# Altium integrated library MU_MP_39_V1.IntLib: 148 symbols (part 1 of 2) (continued)
## K4E8E304EE-EGCE (continued)

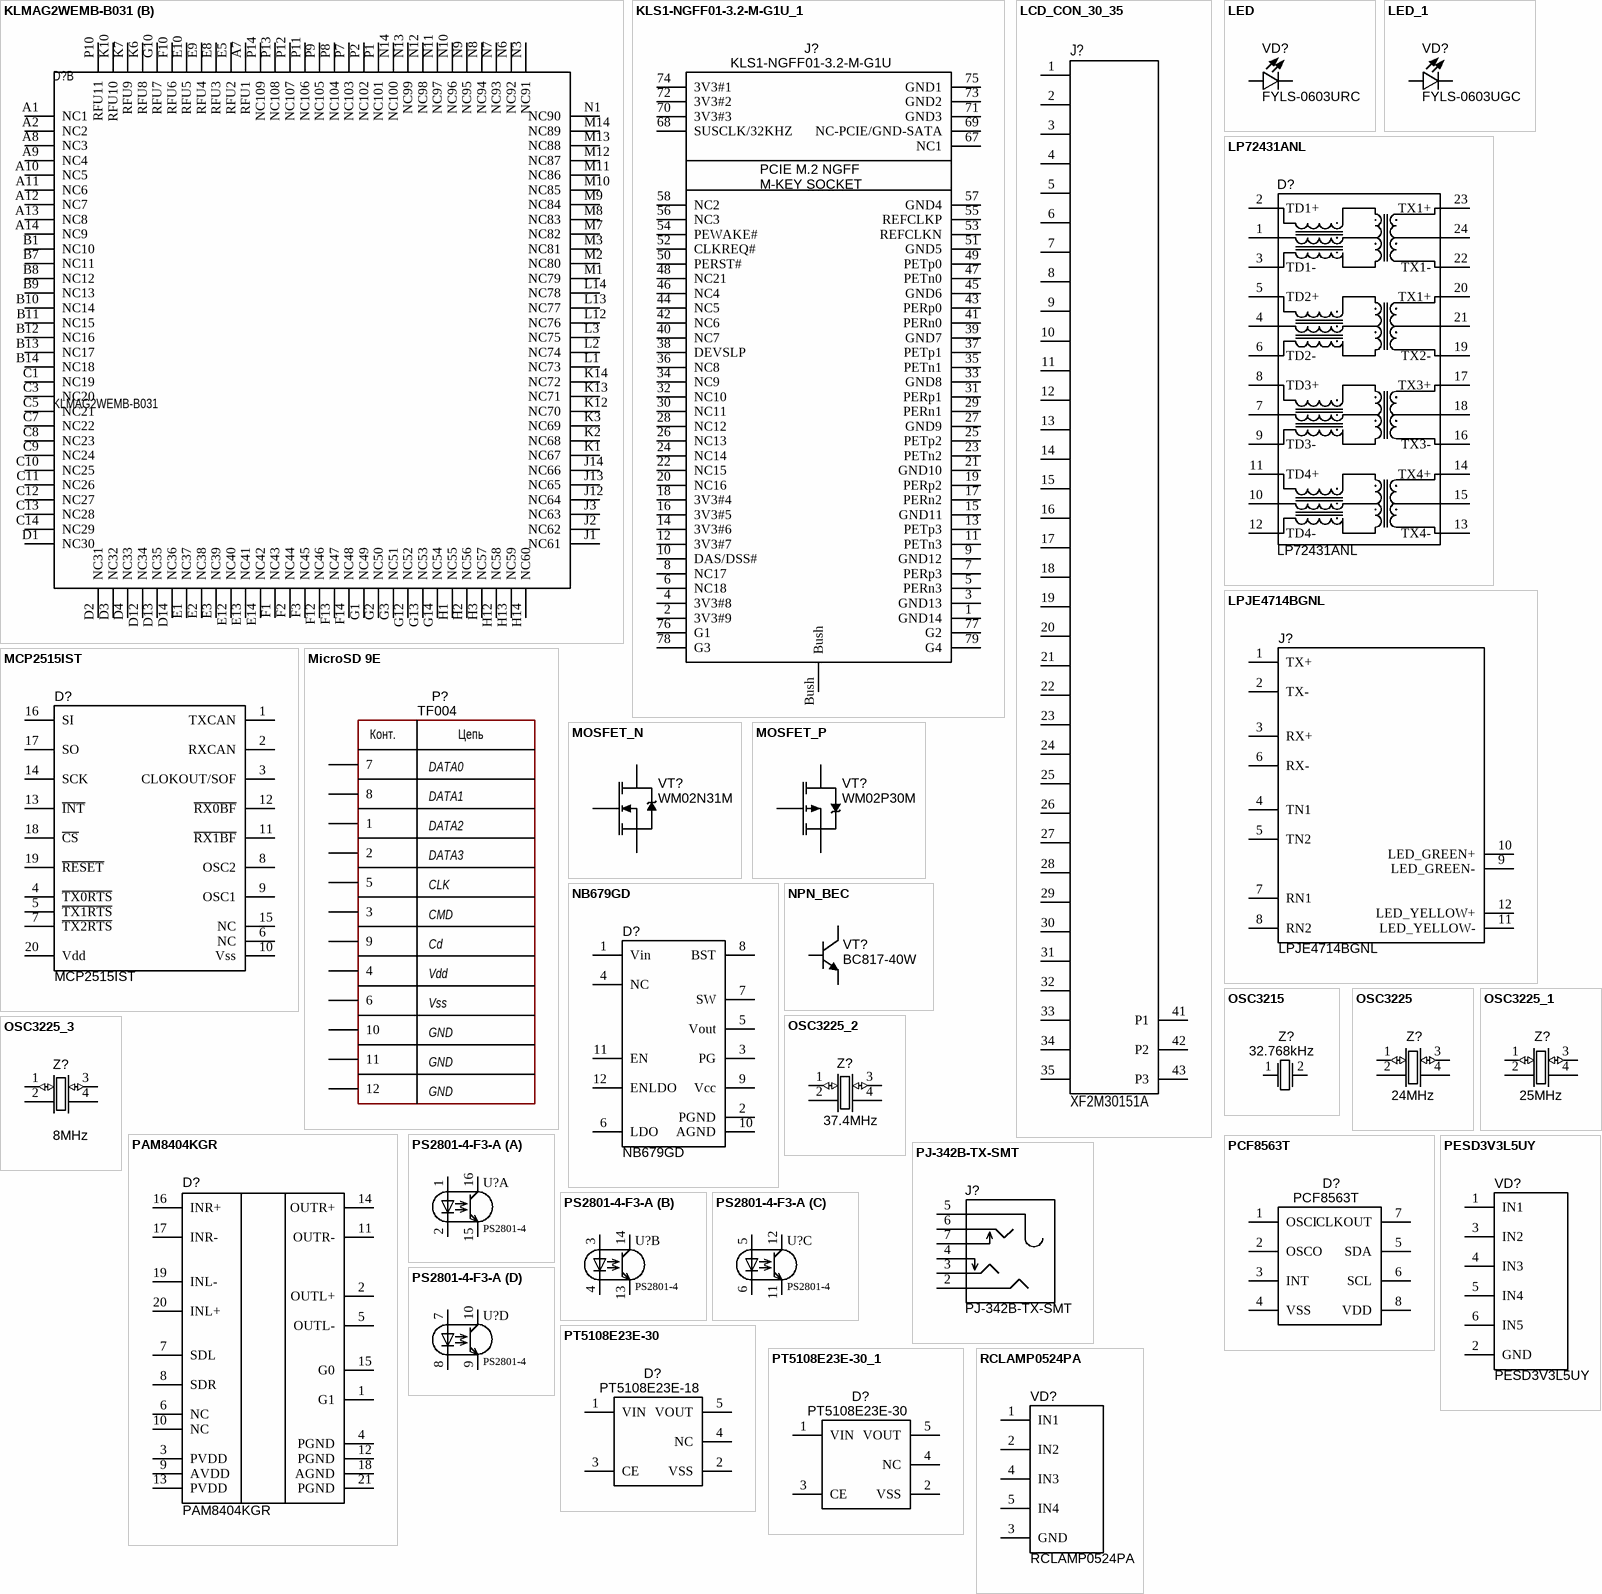
[diagram p3: symbols KLMAG2WEMB-B031 to RCLAMP0524PA]

## KLMAG2WEMB-B031
designator D?
ComponentType: *; Manufacter: *; Package: FBGA153; PartNumber: KLMAG2WEMB-B031; ClassName: *; Value: KLMAG2WEMB-B031
footprint FBGA153
part A pins: A3 DATA0, A4 DATA1, A5 DATA2, A6 VSS, B2 DATA3, B3 DATA4, B4 DATA5, B5 DATA6, B6 DATA7, C2 VDDIM, C4 VSS, C6 VDD, E6 VDDF, E7 VSS, F5 VDDF, G5 VSS, H5 DS, H10 VSS, J5 VSS, J10 VDDF, K5 ~{RST}, K8 VSS, K9 VDDF, M4 VDD, M5 CMD, M6 CLK, N2 VSS, N4 VDD, N5 VSS, P3 VDD, P4 VSS, P5 VDD, P6 VSS
part B pins: A1 NC1, A2 NC2, A7 RFU1, A8 NC3, A9 NC4, A10 NC5, A11 NC6, A12 NC7, A13 NC8, A14 NC9, B1 NC10, B7 NC11, B8 NC12, B9 NC13, B10 NC14, B11 NC15, B12 NC16, B13 NC17, B14 NC18, C1 NC19, C3 NC20, C5 NC21, C7 NC22, C8 NC23, C9 NC24, C10 NC25, C11 NC26, C12 NC27, C13 NC28, C14 NC29, D1 NC30, D2 NC31, D3 NC32, D4 NC33, D12 NC34, D13 NC35, D14 NC36, E1 NC37, E2 NC38, E3 NC39, E5 RFU2, E8 RFU3, E9 RFU4, E10 RFU5, E12 NC40, E13 NC41, E14 NC42, F1 NC43, F2 NC44, F3 NC45, F10 RFU6, F12 NC46, F13 NC47, F14 NC48, G1 NC49, G2 NC50, G3 NC51, G10 RFU7, G12 NC52, G13 NC53, G14 NC54, H1 NC55, H2 NC56, H3 NC57, H12 NC58, H13 NC59, H14 NC60, J1 NC61, J2 NC62, J3 NC63, J12 NC64, J13 NC65, J14 NC66, K1 NC67, K2 NC68, K3 NC69, K6 RFU8, K7 RFU9, K10 RFU10, K12 NC70, K13 NC71, K14 NC72, L1 NC73, L2 NC74, L3 NC75, L12 NC76, L13 NC77, L14 NC78, M1 NC79, M2 NC80, M3 NC81, M7 NC82, M8 NC83, M9 NC84, M10 NC85, M11 NC86, M12 NC87, M13 NC88, M14 NC89, N1 NC90, N3 NC91, N6 NC92, N7 NC93, N8 NC94, N9 NC95, N10 NC96, N11 NC97, N12 NC98, N13 NC99, N14 NC100, P1 NC101, P2 NC102, P7 NC103, P8 NC104, P9 NC105, P10 RFU11, P11 NC106, P12 NC107, P13 NC108, P14 NC109

## KLS1-NGFF01-3.2-M-G1U_1
designator J?, comment KLS1-NGFF01-3.2-M-G1U
ComponentType: SMD Chip Resistor; Manufacter: *; Voltage: *; ClassName: *; Tolerance: *; PartNumber: KLS1-NGFF01-3.2-M-G1U; Package: KLS1-NGFF01-3.2-M-G1U; Value: KLS1-NGFF01-3.2-M-G1U
footprint KLS1-NGFF01-3.2-M-G1U_42mm
pins: 1 GND14, 2 3V3#9, 3 GND13, 4 3V3#8, 5 PERn3, 6 NC18, 7 PERp3, 8 NC17, 9 GND12, 10 DAS/DSS#, 11 PETn3, 12 3V3#7, 13 PETp3, 14 3V3#6, 15 GND11, 16 3V3#5, 17 PERn2, 18 3V3#4, 19 PERp2, 20 NC16, 21 GND10, 22 NC15, 23 PETn2, 24 NC14, 25 PETp2, 26 NC13, 27 GND9, 28 NC12, 29 PERn1, 30 NC11, 31 PERp1, 32 NC10, 33 GND8, 34 NC9, 35 PETn1, 36 NC8, 37 PETp1, 38 DEVSLP, 39 GND7, 40 NC7, 41 PERn0, 42 NC6, 43 PERp0, 44 NC5, 45 GND6, 46 NC4, 47 PETn0, 48 NC21, 49 PETp0, 50 PERST#, 51 GND5, 52 CLKREQ#, 53 REFCLKN, 54 PEWAKE#, 55 REFCLKP, 56 NC3, 57 GND4, 58 NC2, 67 NC1, 68 SUSCLK/32KHZ, 69 NC-PCIE/GND-SATA, 70 3V3#3, 71 GND3, 72 3V3#2, 73 GND2, 74 3V3#1, 75 GND1, 76 G1, 77 G2, 78 G3, 79 G4, Bush
text: PCIE M.2 NGFF / M-KEY SOCKET

## LCD_CON_30_35
designator J?, comment XF2M30151A
ComponentType: *; Manufacter: *; Package: XF2M30151A; PartNumber: XF2M30151A; ClassName: *; Value: XF2M30151A
footprint XF2M-30_3515-1A (Rotary Backclock Connector 40 pin)
pins: 1, 2, 3, 4, 5, 6, 7, 8, 9, 10, 11, 12, 13, 14, 15, 16, 17, 18, 19, 20, 21, 22, 23, 24, 25, 26, 27, 28, 29, 30, 31, 32, 33, 34, 35, 41 P1, 42 P2, 43 P3

## LED
designator VD?, comment FYLS-0603URC
ComponentType: *; Manufacter: *; Package: SMD0603; PartNumber: FYLS-0603URC; Value: FYLS-0603URC
footprint LED_0603
pins: 1 A, 2 C

## LED_1
designator VD?, comment FYLS-0603UGC
ComponentType: *; Manufacter: *; Package: SMD0603; PartNumber: FYLS-0603UGC; Value: FYLS-0603UGC
footprint LED_0603
pins: 1 A, 2 C

## LP72431ANL
designator D?
ComponentType: *; Manufacter: *; Voltage: *; ClassName: *; Tolerance: *; PartNumber: LP72431ANL; Package: LP72431ANL; Value: LP72431ANL
footprint LP72431ANL (pitch 1.27 mm)
pins: 1 TCT1, 2 TD1+, 3 TD1-, 4 TCT2, 5 TD2+, 6 TD2-, 7 TCT3, 8 TD3+, 9 TD3-, 10 TCT4, 11 TD4+, 12 TD4-, 13 TX4-, 14 TX4+, 15 TCT_4, 16 TX3-, 17 TX3+, 18 TCT_3, 19 TX2-, 20 TX1+, 21 TCT_2, 22 TX1-, 23 TX1+, 24 TCT_1

## LPJE4714BGNL
designator J?
ComponentType: *; Manufacter: *; Voltage: *; ClassName: *; Tolerance: *; PartNumber: LPJE4714BGNL; Package: LPJE4714BGNL; Value: LPJE4714BGNL
footprint LPJE4714BGNL
pins: 1 TX+, 2 TX-, 3 RX+, 4 TN1, 5 TN2, 6 RX-, 7 RN1, 8 RN2, 9 LED_GREEN-, 10 LED_GREEN+, 11 LED_YELLOW-, 12 LED_YELLOW+

## MCP2515IST
designator D?
ComponentType: SMD Chip Resistor; Manufacter: *; Voltage: *; ClassName: *; Tolerance: *; PartNumber: MCP2515IST; Package: TSSOP-20; Value: MCP2515IST
footprint TSSOP-20
pins: 1 TXCAN, 2 RXCAN, 3 CLOKOUT/SOF, 4 ~{TX0RTS}, 5 ~{TX1RTS}, 6 NC, 7 ~{TX2RTS}, 8 OSC2, 9 OSC1, 10 Vss, 11 ~{RX1BF}, 12 ~{RX0BF}, 13 ~{INT}, 14 SCK, 15 NC, 16 SI, 17 SO, 18 ~{CS}, 19 ~{RESET}, 20 Vdd

## MicroSD 9E
designator P?, comment TF004
ComponentType: MicroSD conector; Manufacter: *; Package: TF004; PartNumber: TF004; Value: TF004
footprint CON: PLD-12
footprint TF004 (micro sd holder 10 pin)
pins: 1, 2, 3 (power), 4 (power), 5 (power), 6 (power), 7 (power), 8 (power), 9 (power), 10 (power), 11 (power), 12 (power)
text: Конт.; Цепь; DATA0; DATA1; DATA2; DATA3; CLK; CMD; Cd; Vdd; Vss; GND

## MOSFET_N
designator VT?, comment value WM02N31M  (hidden comment: Value)
ComponentType: *; Manufacter: *; Package: SOT23; PartNumber: WM02N31M; ClassName: *
footprint SOT23
pins: 1 G, 2 S, 3 D

## MOSFET_P
designator VT?, comment value WM02P30M  (hidden comment: Value)
ComponentType: *; Manufacter: *; Package: SOT23; PartNumber: WM02P30M; ClassName: *
footprint SOT23
pins: 1 G, 2 S, 3 D

## NB679GD
designator D?
ComponentType: SMD Chip Resistor; Manufacter: *; Voltage: *; ClassName: *; Tolerance: *; PartNumber: NB679GD; Package: QFN-12; Value: NB679GD
footprint QFN-12_2mmx3mm
pins: 1 Vin, 2 PGND, 3 PG, 4 NC, 5 Vout, 6 LDO, 7 SW, 8 BST, 9 Vcc, 10 AGND, 11 EN, 12 ENLDO

## NPN_BEC
designator VT?, comment BC817-40W
ComponentType: *; Manufacter: *; Package: SC-70; PartNumber: BC817-40W; ClassName: *; Value: BC817-40W
footprint SOT23
footprint SC-70
pins: 1 B, 2 E, 3 C

## OSC3215
designator Z?, comment value 32.768kHz  (hidden comment: Value)
PartNumber: SJK-7L-32.768-12.5-20-70-C; ComponentType: *; Manufacter: *; Package: TSX3215
footprint TSX3215
pins: 1, 2

## OSC3225
designator Z?, comment value 24MHz  (hidden comment: Value)
PartNumber: 12.88665; ComponentType: *; Manufacter: *; Package: TSX3225
footprint TSX3225
pins: 1 IN/OUT (io), 2 GND, 3 IN/OUT (io), 4 GND

## OSC3225_1
designator Z?, comment value 25MHz  (hidden comment: Value)
PartNumber: X322525MOB4SI; ComponentType: *; Manufacter: *; Package: TSX3225
footprint TSX3225
pins: 1 IN/OUT (io), 2 GND, 3 IN/OUT (io), 4 GND

## OSC3225_2
designator Z?, comment value 37.4MHz  (hidden comment: Value)
PartNumber: X3225374MOB4SI; ComponentType: *; Manufacter: *; Package: TSX3225
footprint TSX3225
pins: 1 IN/OUT (io), 2 GND, 3 IN/OUT (io), 4 GND

## OSC3225_3
designator Z?, comment value 8MHz  (hidden comment: Value)
PartNumber: X32258MOB4SI; ComponentType: *; Manufacter: *; Package: TSX3225
footprint TSX3225
pins: 1 IN/OUT (io), 2 GND, 3 IN/OUT (io), 4 GND

## PAM8404KGR
designator D?
ComponentType: SMD Chip Resistor; Manufacter: *; Voltage: *; ClassName: *; Tolerance: *; PartNumber: PAM8404KGR; Package: QFN-20; Value: PAM8404KGR
footprint QFN-20 4mmx4mm
pins: 1 G1, 2 OUTL+, 3 PVDD, 4 PGND, 5 OUTL-, 6 NC, 7 SDL, 8 SDR, 9 AVDD, 10 NC, 11 OUTR-, 12 PGND, 13 PVDD, 14 OUTR+, 15 G0, 16 INR+, 17 INR-, 18 AGND, 19 INL-, 20 INL+, 21 PGND

## PCF8563T
designator D?
ComponentType: SMD Chip Resistor; Manufacter: *; Voltage: *; ClassName: *; Tolerance: *; PartNumber: PCF8563T; Package: SO8; Value: PCF8563T
footprint SO8 (pitch 1.27 mm)
pins: 1 OSCI, 2 OSCO, 3 INT, 4 VSS, 5 SDA, 6 SCL, 7 CLKOUT, 8 VDD

## PESD3V3L5UY
designator VD?
ComponentType: *; Manufacter: *; Package: SC70-6; PartNumber: PESD3V3L5UY; ClassName: *; Value: PESD3V3L5UY
footprint SC70-6 (SOT23, 5-Leads, Body 2,90x2,80mm, Pitch 0,95mm, IPC Medium Density)
pins: 1 IN1, 2 GND, 3 IN2, 4 IN3, 5 IN4, 6 IN5

## PJ-342B-TX-SMT
designator J?
ComponentType: SMD Chip Resistor; Manufacter: *; Voltage: *; ClassName: *; Tolerance: *; PartNumber: PJ-342B-TX-SMT; Package: PJ-342B-TX-SMT; Value: PJ-342B-TX-SMT
footprint PJ-342B-TX-SMT
pins: 2, 3, 4, 5, 6, 7

## PS2801-4-F3-A
designator U?, comment PS2801-4
Optocoupler X4; Manufacturer: Renesas; PartNumber: PS2801-4-F3-A; Comments: 80V, 50mA; Value: PS2801-4; Package: SOIC127P700X210-16N; ClassName: *
footprint SOIC127P700X210-16N (SOIC, 16-Leads, Body 10.30x4.40mm, Pitch 1.27mm, IPC Medium Density)
part A pins: 1 A, 2 C, 15 E, 16 C
part B pins: 3 A, 4 C, 13 E, 14 C
part C pins: 5 A, 6 C, 11 E, 12 C
part D pins: 7 A, 8 C, 9 E, 10 C

## PT5108E23E-30
designator D?, comment PT5108E23E-18
ComponentType: SMD Chip Resistor; Manufacter: *; Voltage: *; ClassName: *; Tolerance: *; PartNumber: PT5108E23E-18; Package: SOT23-5; Value: PT5108E23E-18
footprint SOT23-5 (pitch 0.95 mm)
pins: 1 VIN, 2 VSS, 3 CE, 4 NC, 5 VOUT

## PT5108E23E-30_1
designator D?, comment PT5108E23E-30
ComponentType: SMD Chip Resistor; Manufacter: *; Voltage: *; ClassName: *; Tolerance: *; PartNumber: PT5108E23E-30; Package: SOT23-5; Value: PT5108E23E-30
footprint SOT23-5 (pitch 0.95 mm)
pins: 1 VIN, 2 VSS, 3 CE, 4 NC, 5 VOUT

## RCLAMP0524PA
designator VD?
ComponentType: *; Manufacter: *; Package: RCLAMP0524PA; PartNumber: RCLAMP0524PA; ClassName: *; Value: RCLAMP0524PA
footprint RCLAMP0524PA
pins: 1 IN1, 2 IN2, 3 GND, 4 IN3, 5 IN4

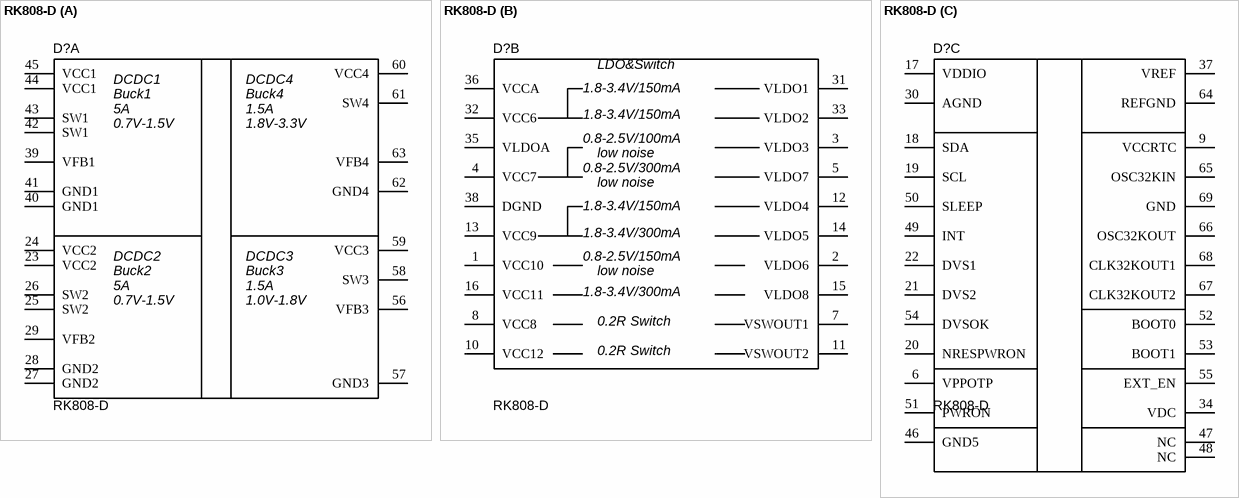
[diagram p4: symbol RK808-D]

## RK808-D
designator D?
ComponentType: SMD Chip Resistor; Manufacter: *; Voltage: *; ClassName: *; Tolerance: *; PartNumber: RK808-D; Package: QFN68; Value: RK808-D
footprint QFN35P700X700X80-69N
part A pins: 23 VCC2, 24 VCC2, 25 SW2, 26 SW2, 27 GND2, 28 GND2, 29 VFB2, 39 VFB1, 40 GND1, 41 GND1, 42 SW1, 43 SW1, 44 VCC1, 45 VCC1, 56 VFB3, 57 GND3, 58 SW3, 59 VCC3, 60 VCC4, 61 SW4, 62 GND4, 63 VFB4
part B pins: 1 VCC10, 2 VLDO6, 3 VLDO3, 4 VCC7, 5 VLDO7, 7 VSWOUT1, 8 VCC8, 10 VCC12, 11 VSWOUT2, 12 VLDO4, 13 VCC9, 14 VLDO5, 15 VLDO8, 16 VCC11, 31 VLDO1, 32 VCC6, 33 VLDO2, 35 VLDOA, 36 VCCA, 38 DGND
part C pins: 6 VPPOTP, 9 VCCRTC, 17 VDDIO, 18 SDA, 19 SCL, 20 NRESPWRON, 21 DVS2, 22 DVS1, 30 AGND, 34 VDC, 37 VREF, 46 GND5, 47 NC, 48 NC, 49 INT, 50 SLEEP, 51 PWRON, 52 BOOT0, 53 BOOT1, 54 DVSOK, 55 EXT_EN, 64 REFGND, 65 OSC32KIN, 66 OSC32KOUT, 67 CLK32KOUT2, 68 CLK32KOUT1, 69 GND

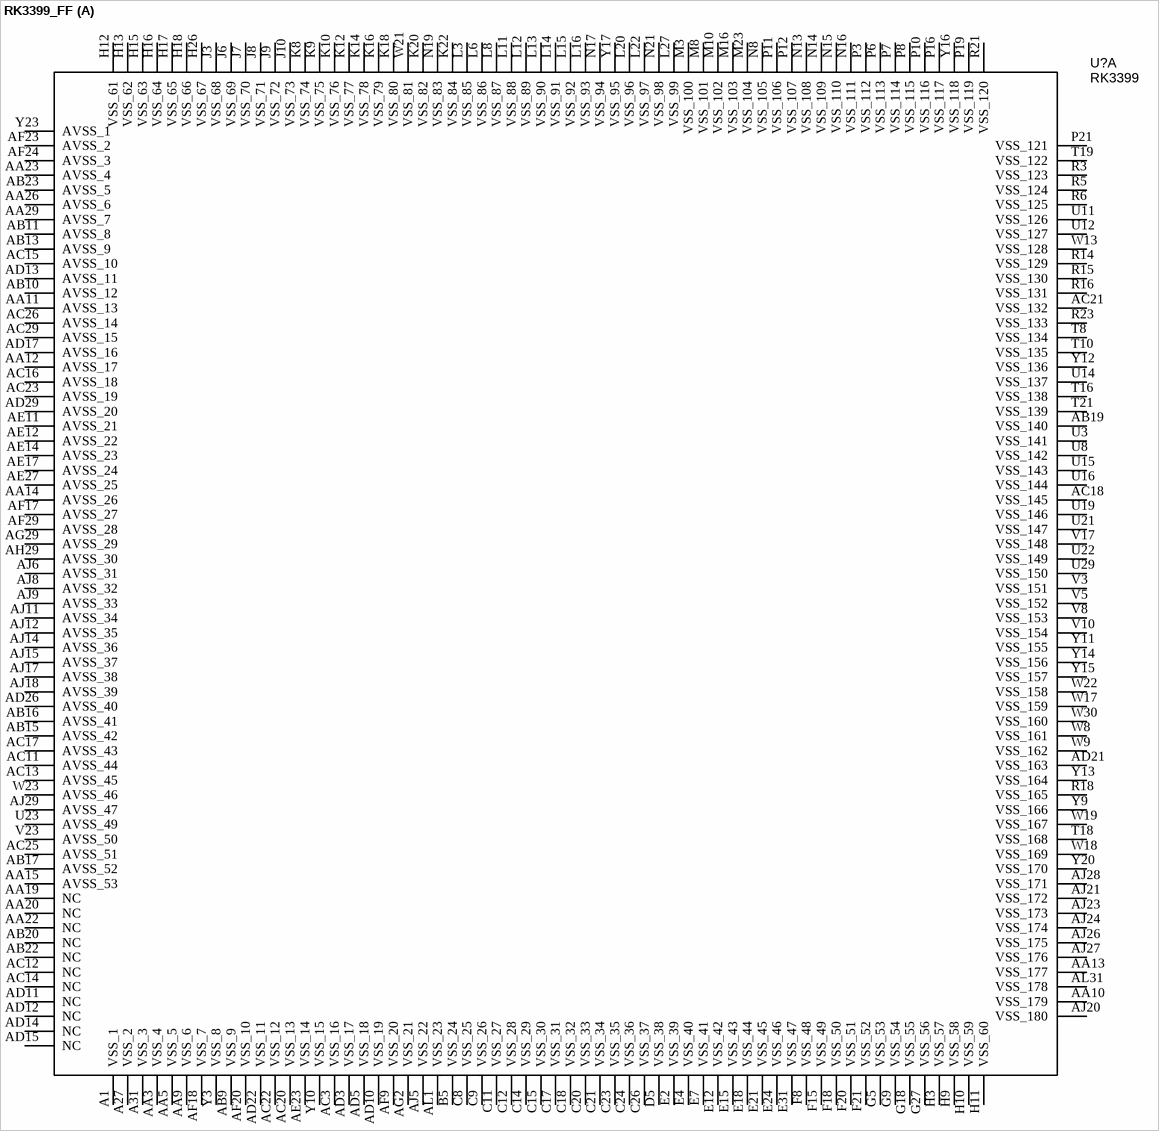
[diagram p5: symbol RK3399_FF]

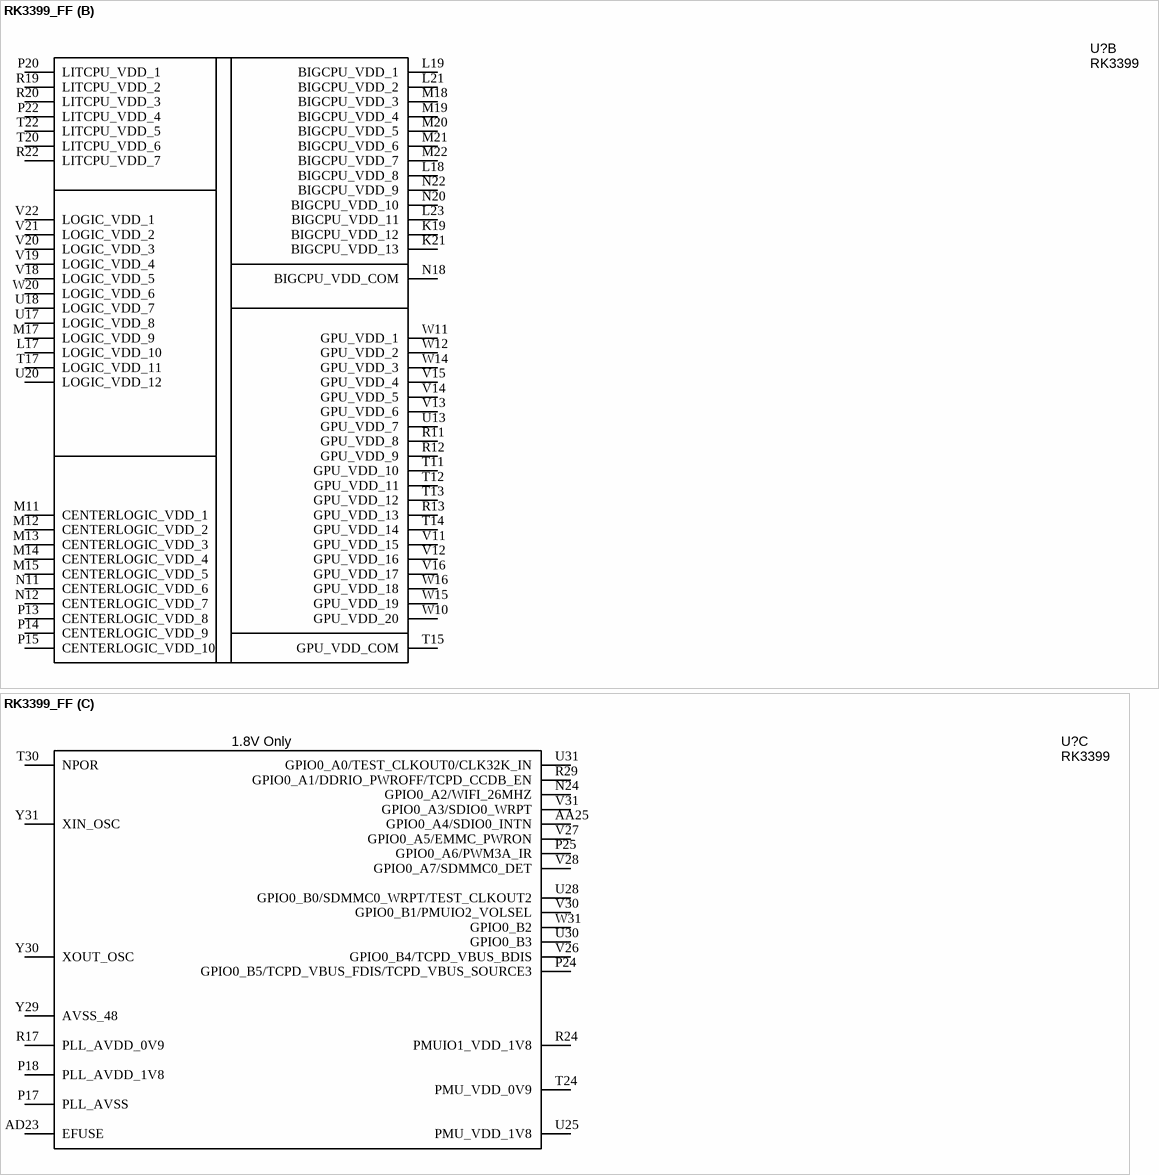
[diagram p6: symbol RK3399_FF]

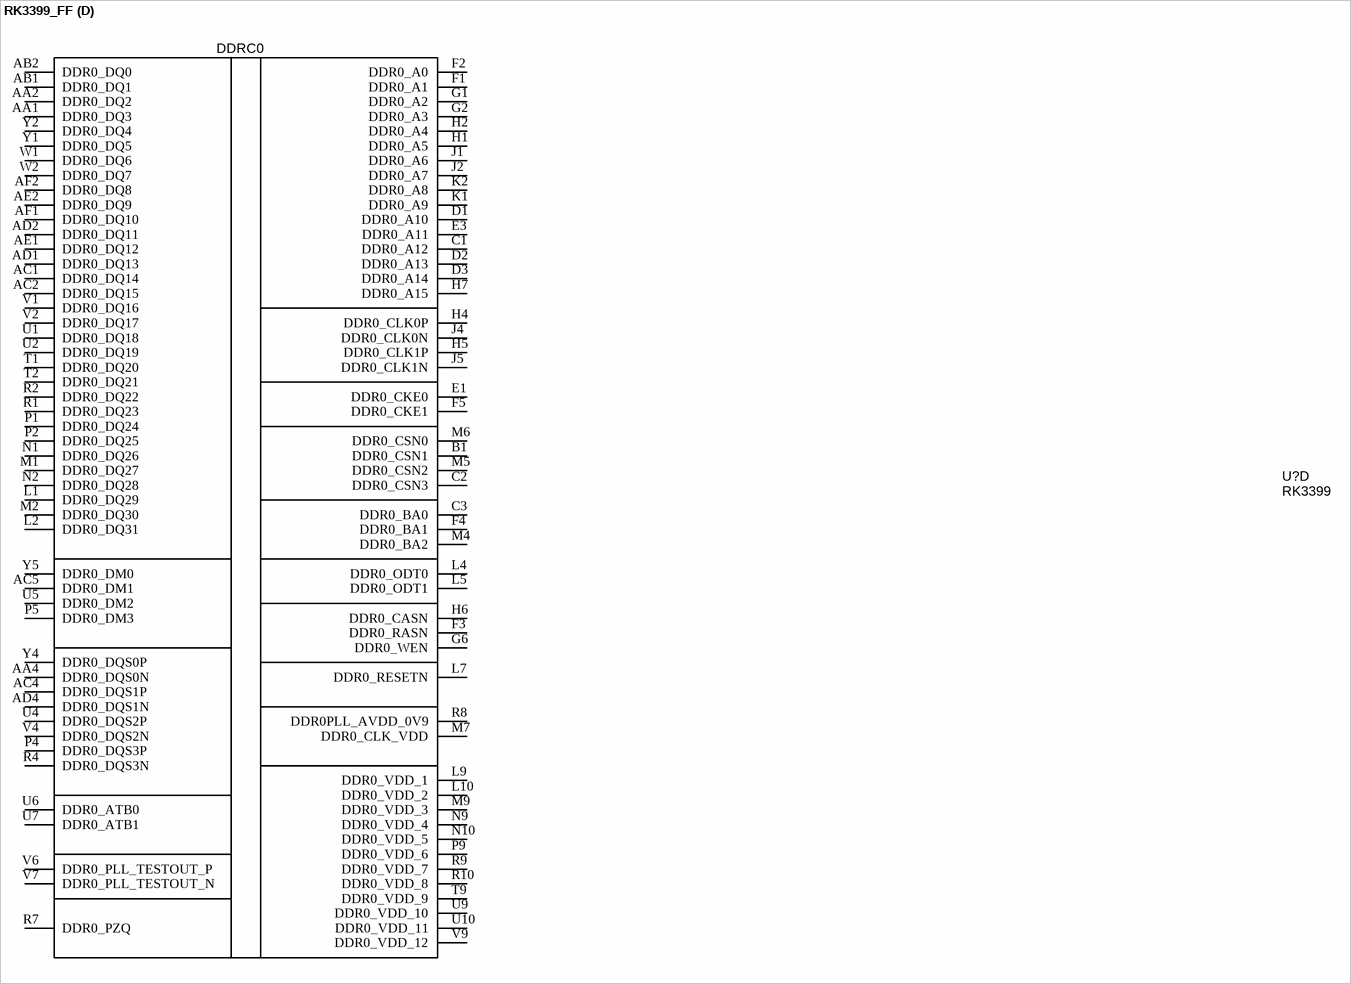
[diagram p7: symbol RK3399_FF]

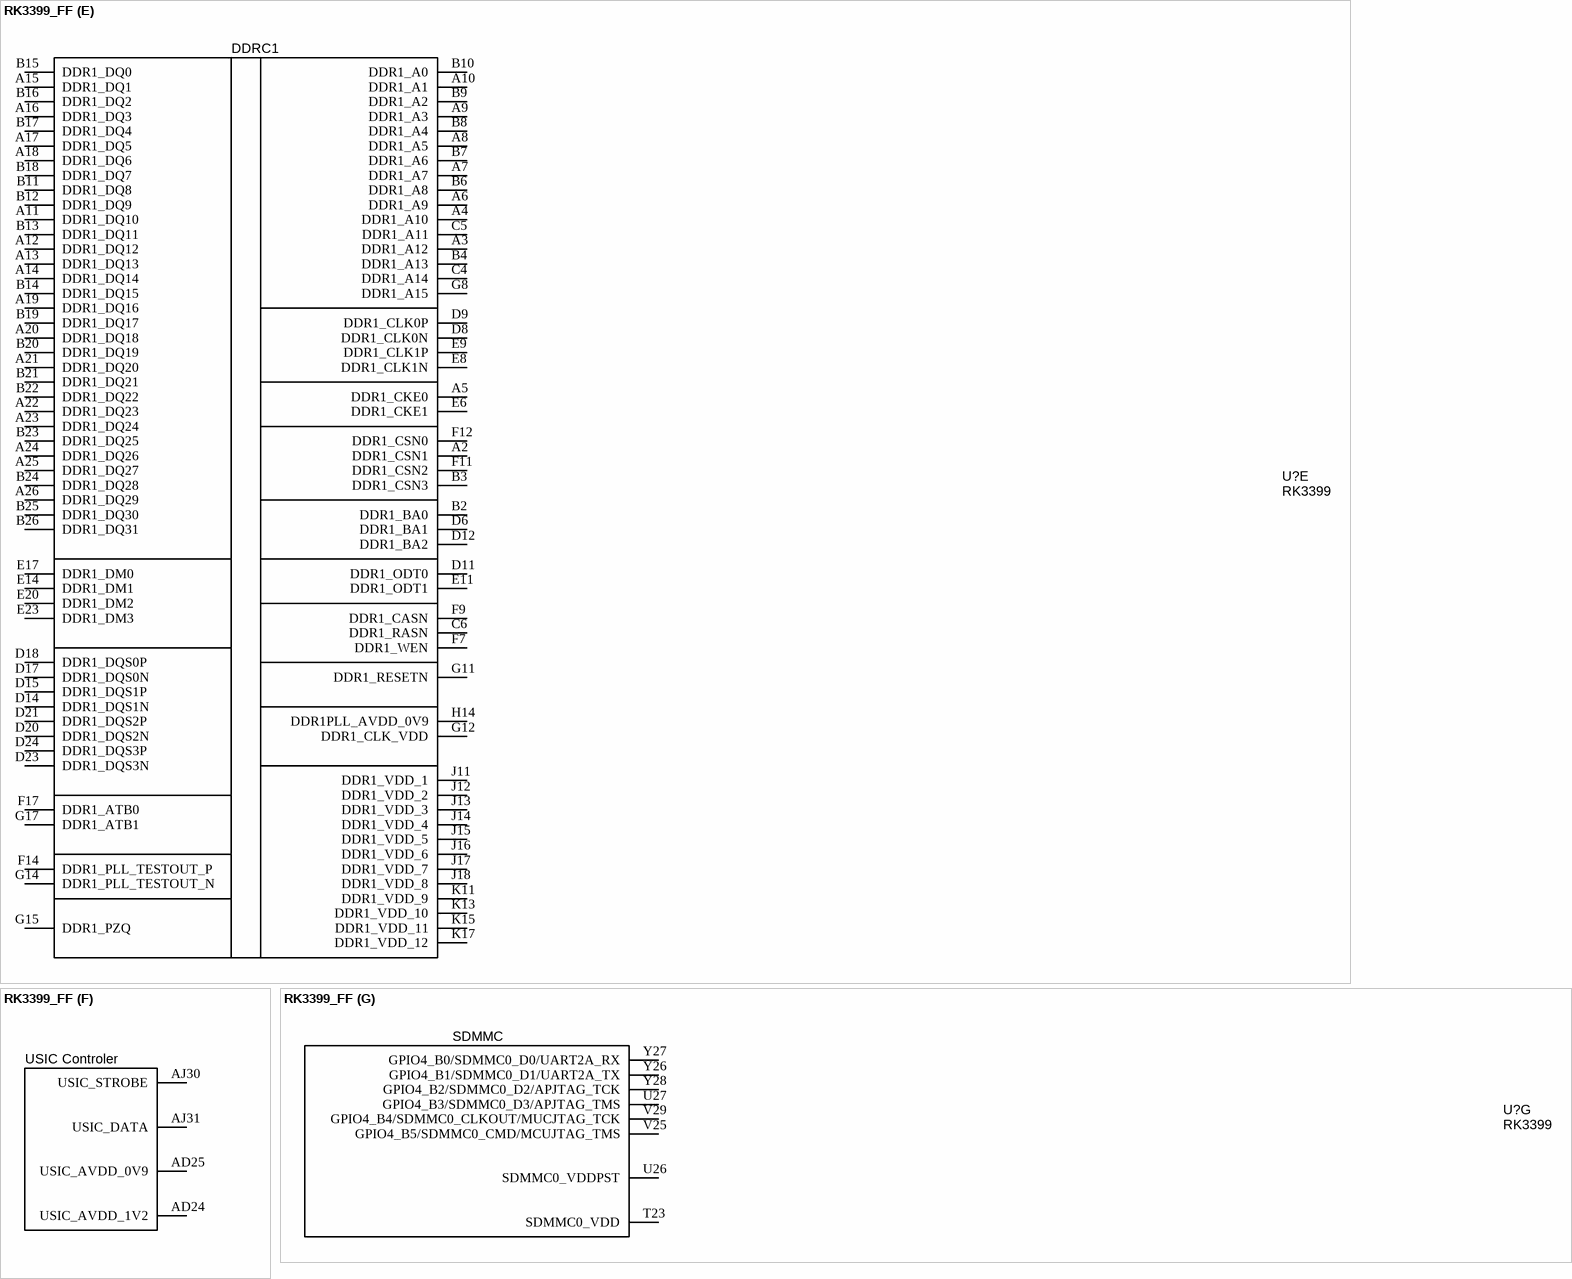
[diagram p8: symbol RK3399_FF]

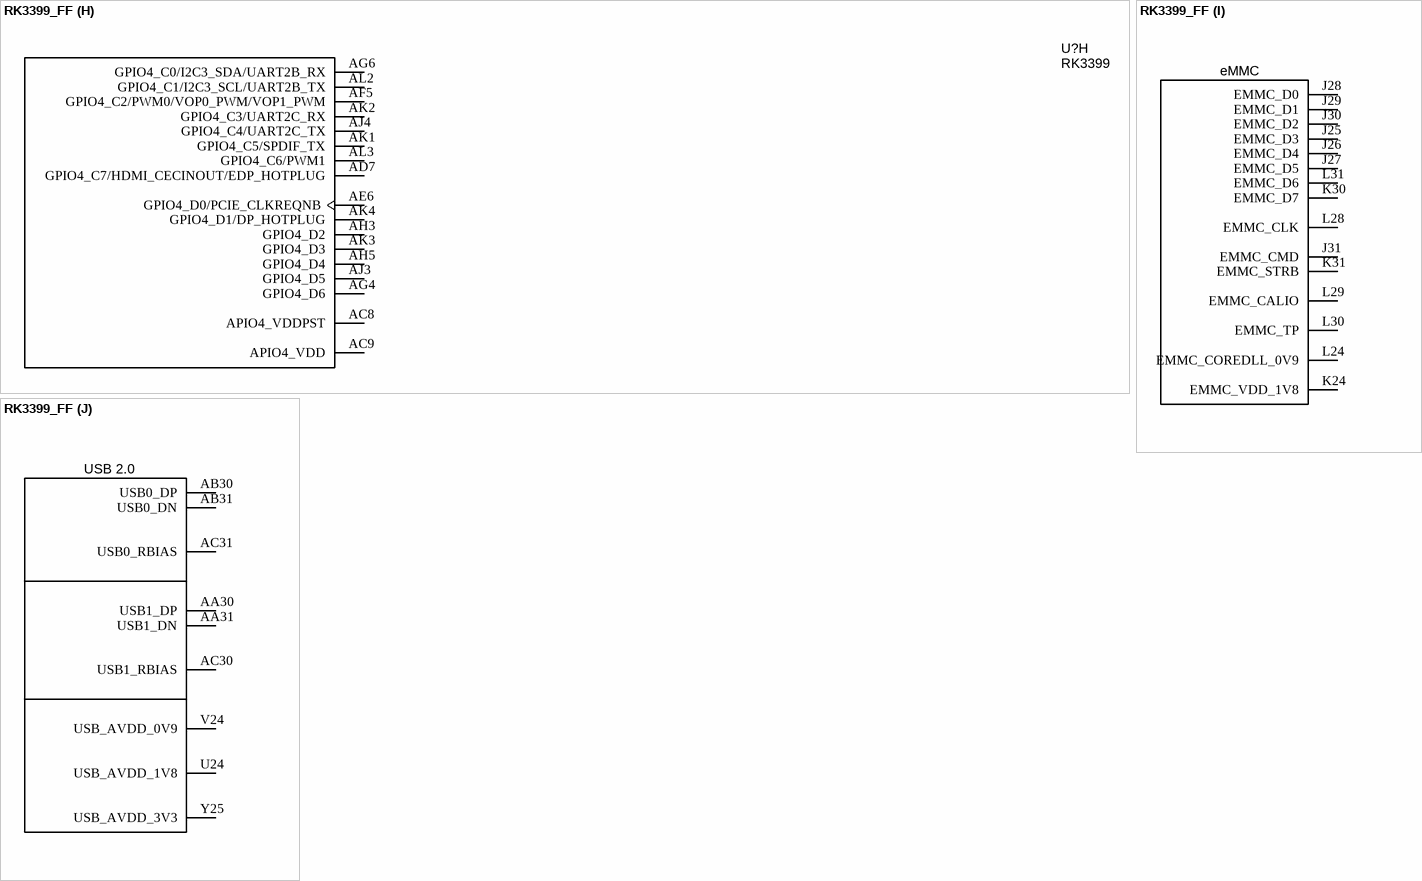
[diagram p9: symbol RK3399_FF]

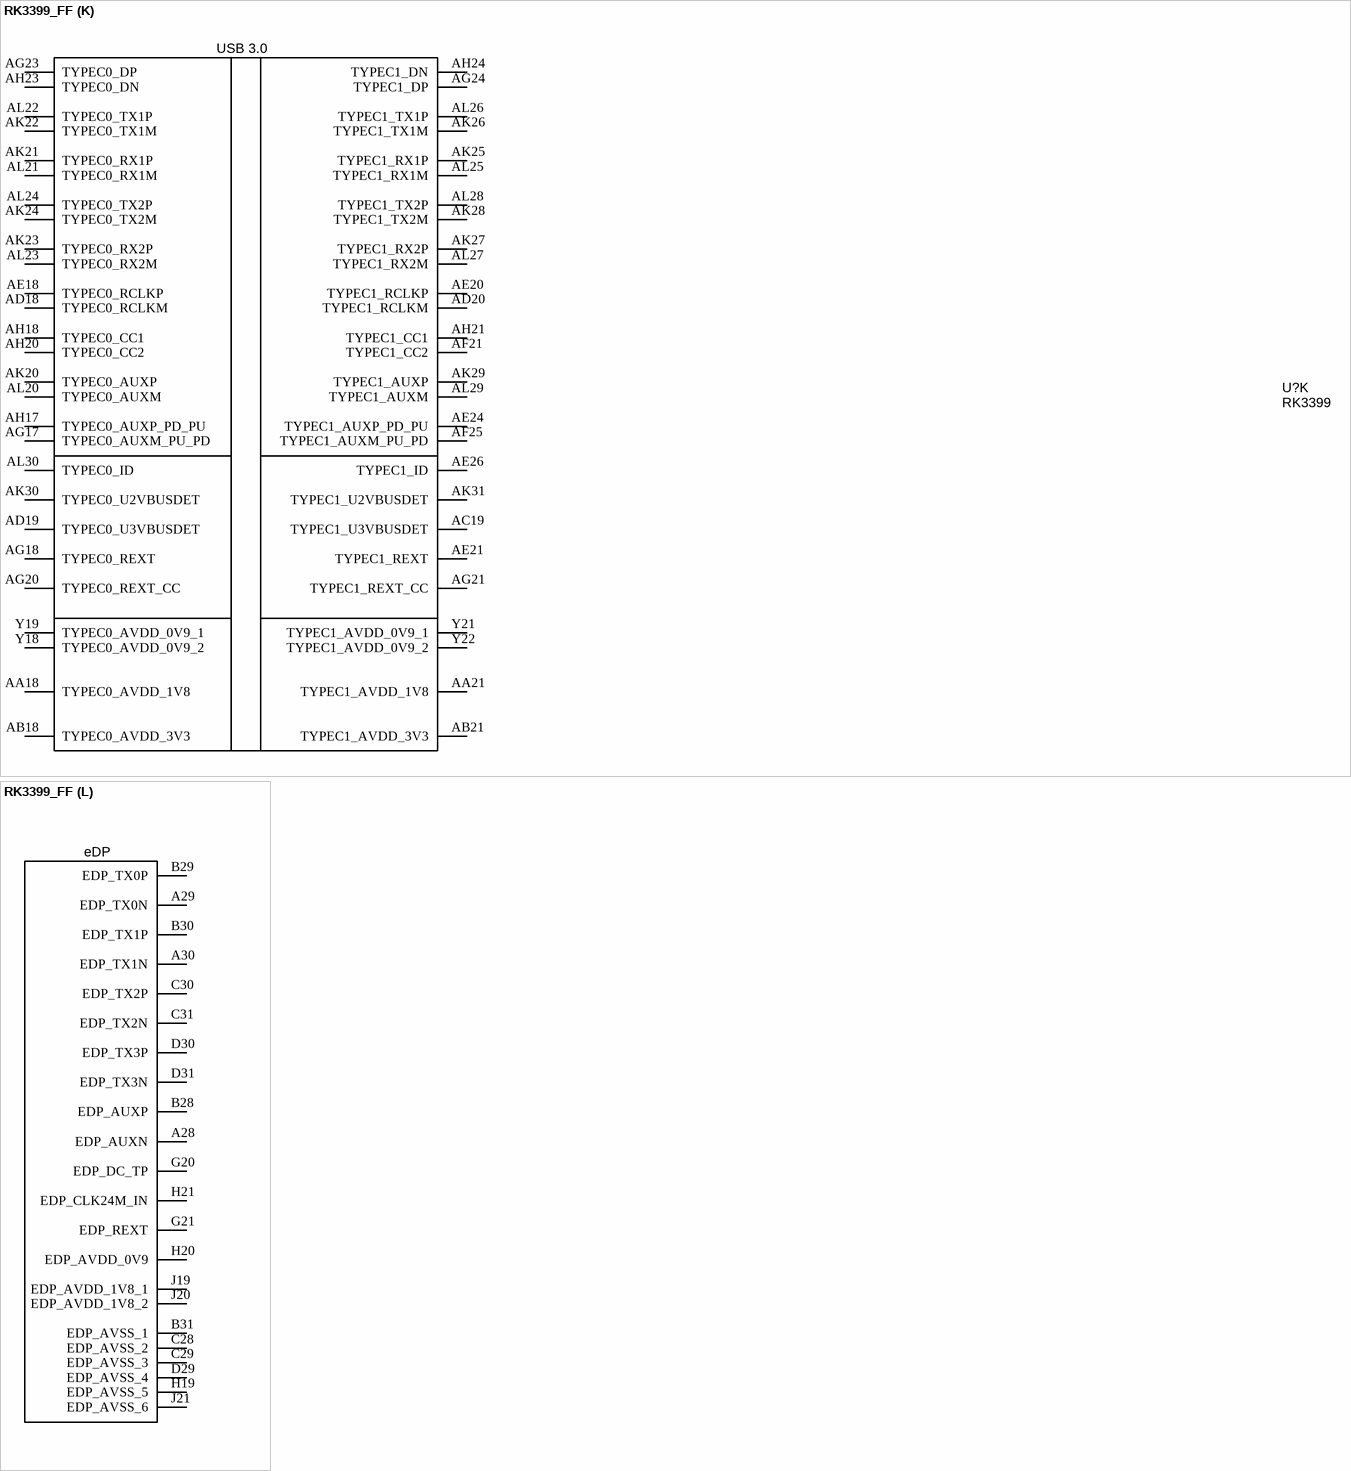
[diagram p10: symbol RK3399_FF]
